# Altium footprint library Connectors.PcbLib: 245 footprints (part 10 of 18) (continued)
## CNSODIMM200-1V8STD [mm] "Tyco 1473006-4" (continued)
Mechanical 13:
  lines w0.127: 1.85,-33.8 32.1,-33.8 32.1,33.8 1.85,33.8 ; 1.85,-32.55 3.7,-32.55 3.7,32.55 ; 16.422,-33.661 16.425,-32.5 16.575,-32.225 18.55,-31.7 21.35,-31.9 21.65,-32.15 21.65,-33.225 21.45,-33.425 ; 16.422,33.661 16.425,32.5 16.575,32.225 18.55,31.7 21.35,31.9 21.65,32.15 21.65,33.225 21.45,33.425 ; 3.7,32.55 1.85,32.55 3.7,32.55 ; -5,-35.55 -5,-32.55 -3.7,-32.55 -3.7,32.55 -5,32.55 -5,35.55 1.85,35.55 1.85,-35.55 -5,-35.55
  lines w0.4: 2,-34.425 7.875,-34.425 9.2,-35.75 16.4,-35.75 ; 2,-34.025 8.675,-34.025 21.45,-33.425 ; 2,34.025 8.675,34.025 21.45,33.425 ; 2,34.425 7.875,34.425 9.2,35.75 16.4,35.75

## CNSODIMM204-1V5STD [mm] "Foxconn"
height 5.2
pads (208):
  rrect50% 2x0.35 smd: 1(-4.1,31.65) 2(4.1,31.35) 3(-4.1,31.05) 4(4.1,30.75) 5(-4.1,30.45) 6(4.1,30.15) 7(-4.1,29.85) 8(4.1,29.55) 9(-4.1,29.25) 10(4.1,28.95) 11(-4.1,28.65) 12(4.1,28.35) 13(-4.1,28.05) 14(4.1,27.75) 15(-4.1,27.45) 16(4.1,27.15) 17(-4.1,26.85) 18(4.1,26.55) 19(-4.1,26.25) 20(4.1,25.95) 21(-4.1,25.65) 22(4.1,25.35) 23(-4.1,25.05) 24(4.1,24.75) 25(-4.1,24.45) 26(4.1,24.15) 27(-4.1,23.85) 28(4.1,23.55) 29(-4.1,23.25) 30(4.1,22.95) 31(-4.1,22.65) 32(4.1,22.35) 33(-4.1,22.05) 34(4.1,21.75) 35(-4.1,21.45) 36(4.1,21.15) 37(-4.1,20.85) 38(4.1,20.55) 39(-4.1,20.25) 40(4.1,19.95) 41(-4.1,19.65) 42(4.1,19.35) 43(-4.1,19.05) 44(4.1,18.75) 45(-4.1,18.45) 46(4.1,18.15) 47(-4.1,17.85) 48(4.1,17.55) 49(-4.1,17.25) 50(4.1,16.95) 51(-4.1,16.65) 52(4.1,16.35) 53(-4.1,16.05) 54(4.1,15.75) 55(-4.1,15.45) 56(4.1,15.15) 57(-4.1,14.85) 58(4.1,14.55) 59(-4.1,14.25) 60(4.1,13.95) 61(-4.1,13.65) 62(4.1,13.35) 63(-4.1,13.05) 64(4.1,12.75) 65(-4.1,12.45) 66(4.1,12.15) 67(-4.1,11.85) 68(4.1,11.55) 69(-4.1,11.25) 70(4.1,10.95) 71(-4.1,10.65) 72(4.1,10.35) 73(-4.1,7.65) 74(4.1,7.35) 75(-4.1,7.05) 76(4.1,6.75) 77(-4.1,6.45) 78(4.1,6.15) 79(-4.1,5.85) 80(4.1,5.55) 81(-4.1,5.25) 82(4.1,4.95) 83(-4.1,4.65) 84(4.1,4.35) 85(-4.1,4.05) 86(4.1,3.75) 87(-4.1,3.45) 88(4.1,3.15) 89(-4.1,2.85) 90(4.1,2.55) 91(-4.1,2.25) 92(4.1,1.95) 93(-4.1,1.65) 94(4.1,1.35) 95(-4.1,1.05) 96(4.1,0.75) 97(-4.1,0.45) 98(4.1,0.15) 99(-4.1,-0.15) 100(4.1,-0.45) 101(-4.1,-0.75) 102(4.1,-1.05) 103(-4.1,-1.35) 104(4.1,-1.65) 105(-4.1,-1.95) 106(4.1,-2.25) 107(-4.1,-2.55) 108(4.1,-2.85) 109(-4.1,-3.15) 110(4.1,-3.45) 111(-4.1,-3.75) 112(4.1,-4.05) 113(-4.1,-4.35) 114(4.1,-4.65) 115(-4.1,-4.95) 116(4.1,-5.25) 117(-4.1,-5.55) 118(4.1,-5.85) 119(-4.1,-6.15) 120(4.1,-6.45) 121(-4.1,-6.75) 122(4.1,-7.05) 123(-4.1,-7.35) 124(4.1,-7.65) 125(-4.1,-7.95) 126(4.1,-8.25) 127(-4.1,-8.55) 128(4.1,-8.85) 129(-4.1,-9.15) 130(4.1,-9.45) 131(-4.1,-9.75) 132(4.1,-10.05) 133(-4.1,-10.35) 134(4.1,-10.65) 135(-4.1,-10.95) 136(4.1,-11.25) 137(-4.1,-11.55) 138(4.1,-11.85) 139(-4.1,-12.15) 140(4.1,-12.45) 141(-4.1,-12.75) 142(4.1,-13.05) 143(-4.1,-13.35) 144(4.1,-13.65) 145(-4.1,-13.95) 146(4.1,-14.25) 147(-4.1,-14.55) 148(4.1,-14.85) 149(-4.1,-15.15) 150(4.1,-15.45) 151(-4.1,-15.75) 152(4.1,-16.05) 153(-4.1,-16.35) 154(4.1,-16.65) 155(-4.1,-16.95) 156(4.1,-17.25) 157(-4.1,-17.55) 158(4.1,-17.85) 159(-4.1,-18.15) 160(4.1,-18.45) 161(-4.1,-18.75) 162(4.1,-19.05) 163(-4.1,-19.35) 164(4.1,-19.65) 165(-4.1,-19.95) 166(4.1,-20.25) 167(-4.1,-20.55) 168(4.1,-20.85) 169(-4.1,-21.15) 170(4.1,-21.45) 171(-4.1,-21.75) 172(4.1,-22.05) 173(-4.1,-22.35) 174(4.1,-22.65) 175(-4.1,-22.95) 176(4.1,-23.25) 177(-4.1,-23.55) 178(4.1,-23.85) 179(-4.1,-24.15) 180(4.1,-24.45) 181(-4.1,-24.75) 182(4.1,-25.05) 183(-4.1,-25.35) 184(4.1,-25.65) 185(-4.1,-25.95) 186(4.1,-26.25) 187(-4.1,-26.55) 188(4.1,-26.85) 189(-4.1,-27.15) 190(4.1,-27.45) 191(-4.1,-27.75) 192(4.1,-28.05) 193(-4.1,-28.35) 194(4.1,-28.65) 195(-4.1,-28.95) 196(4.1,-29.25) 197(-4.1,-29.55) 198(4.1,-29.85) 199(-4.1,-30.15) 200(4.1,-30.45) 201(-4.1,-30.75) 202(4.1,-31.05) 203(-4.1,-31.35) 204(4.1,-31.65)
  round 0 hole 1.6 unplated mask+1: MH1(0,33.4)
  round 0 hole 1.1 unplated mask+1: MH2(0,-33.4)
  rect 4.6x3.5 smd: MP1(12,32.8) MP2(12,-32.8)
Mechanical 10:
  drawing of 168 lines, arcs and shapes, not listed
Mechanical 13:
  lines w0.127: 20.9,-33.8 31.5,-33.8 31.5,33.8 20.9,33.8 ; 20.9,35.05 20.9,32.8 13.5,32.8 13.5,31.65 10.5,31.65 10.5,32.8 3.1,32.8 3.1,-32.8 10.5,-32.8 10.5,-31.65 13.5,-31.65 13.5,-32.8 20.9,-32.8 20.9,-35.1 -1.45,-35.1 ccw(c-2.174,-35.824) -2.174,-34.8 -5,-34.8 -5,-34 -3.1,-34 -3.1,34 -5,34 -5,34.8 -2.174,34.8 ccw(c-2.174,35.824) -1.45,35.1 20.9,35.1
Mechanical 15:
  text "Component height under module max is 1.3mm" at 24.8,31.8 h1.52
3D body: height 5.03, standoff -0.82, extent -5.025,-35.1 20.875,35.1
3D body: height 5.13, standoff 3.78, extent 7.935,-1.3 12.635,2.3
3D body: height 5.13, standoff 3.78, extent 7.935,-27.3 26.535,-18.3
3D body: height 2.68, standoff 1.33, extent 7.935,-27.3 26.535,-18.3
3D body: height 5.13, standoff 3.78, extent 7.935,-16 26.535,-7
3D body: height 2.68, standoff 1.33, extent 7.935,-16 26.535,-7
3D body: height 5.13, standoff 3.78, extent 7.935,7 26.535,16
3D body: height 2.68, standoff 1.33, extent 7.935,7 26.535,16
3D body: height 2.68, standoff 1.33, extent 7.935,18.3 26.535,27.3
3D body: height 5.13, standoff 3.78, extent 7.935,18.3 26.535,27.3
3D body: height 2.68, standoff 2.67, extent -0.415,-31.35 2.135,-31.021
3D body: height 3.79, standoff 3.78, extent -0.415,-31.35 2.135,-31.021
3D body: height 2.68, standoff 2.67, extent -0.415,-30.868 2.135,-30.538
3D body: height 3.79, standoff 3.78, extent -0.415,-30.868 2.135,-30.538
3D body: height 2.68, standoff 2.67, extent -0.415,-30.411 2.135,-30.081
3D body: height 3.79, standoff 3.78, extent -0.415,-30.411 2.135,-30.081
3D body: height 2.68, standoff 2.67, extent -0.415,-29.928 2.135,-29.599
3D body: height 3.79, standoff 3.78, extent -0.415,-29.928 2.135,-29.599
3D body: height 2.68, standoff 2.67, extent -0.415,-29.445 2.135,-29.116
3D body: height 3.79, standoff 3.78, extent -0.415,-29.445 2.135,-29.116
3D body: height 2.68, standoff 2.67, extent -0.415,-28.988 2.135,-28.659
3D body: height 3.79, standoff 3.78, extent -0.415,-28.988 2.135,-28.659
3D body: height 2.68, standoff 2.67, extent -0.415,-28.506 2.135,-28.176
3D body: height 3.79, standoff 3.78, extent -0.415,-28.506 2.135,-28.176
3D body: height 2.68, standoff 2.67, extent -0.415,-27.998 2.135,-27.668
3D body: height 3.79, standoff 3.78, extent -0.415,-27.998 2.135,-27.668
3D body: height 2.68, standoff 2.67, extent -0.415,-27.54 2.135,-27.211
3D body: height 3.79, standoff 3.78, extent -0.415,-27.54 2.135,-27.211
3D body: height 2.68, standoff 2.67, extent -0.415,-27.058 2.135,-26.728
3D body: height 3.79, standoff 3.78, extent -0.415,-27.058 2.135,-26.728
3D body: height 2.68, standoff 2.67, extent -0.415,-26.575 2.135,-26.246
3D body: height 3.79, standoff 3.78, extent -0.415,-26.575 2.135,-26.246
3D body: height 2.68, standoff 2.67, extent -0.415,-26.093 2.135,-25.763
3D body: height 3.79, standoff 3.78, extent -0.415,-26.093 2.135,-25.763
3D body: height 2.68, standoff 2.67, extent -0.415,-25.635 2.135,-25.306
3D body: height 3.79, standoff 3.78, extent -0.415,-25.635 2.135,-25.306
3D body: height 2.68, standoff 2.67, extent -0.415,-25.153 2.135,-24.823
3D body: height 3.79, standoff 3.78, extent -0.415,-25.153 2.135,-24.823
3D body: height 2.68, standoff 2.67, extent -0.415,-24.67 2.135,-24.341
3D body: height 3.79, standoff 3.78, extent -0.415,-24.67 2.135,-24.341
3D body: height 2.68, standoff 2.67, extent -0.415,-24.188 2.135,-23.858
3D body: height 3.79, standoff 3.78, extent -0.415,-24.188 2.135,-23.858
3D body: height 2.68, standoff 2.67, extent -0.415,-23.705 2.135,-23.376
3D body: height 3.79, standoff 3.78, extent -0.415,-23.705 2.135,-23.376
3D body: height 2.68, standoff 2.67, extent -0.415,-23.222 2.135,-22.893
3D body: height 3.79, standoff 3.78, extent -0.415,-23.222 2.135,-22.893
3D body: height 2.68, standoff 2.67, extent -0.415,-22.74 2.135,-22.41
3D body: height 3.79, standoff 3.78, extent -0.415,-22.74 2.135,-22.41
3D body: height 2.68, standoff 2.67, extent -0.415,-22.283 2.135,-21.953
3D body: height 3.79, standoff 3.78, extent -0.415,-22.283 2.135,-21.953
3D body: height 2.68, standoff 2.67, extent -0.415,-21.8 2.135,-21.471
3D body: height 3.79, standoff 3.78, extent -0.415,-21.8 2.135,-21.471
3D body: height 2.68, standoff 2.67, extent -0.415,-21.317 2.135,-20.988
3D body: height 3.79, standoff 3.78, extent -0.415,-21.317 2.135,-20.988
3D body: height 2.68, standoff 2.67, extent -0.415,-20.86 2.135,-20.531
3D body: height 3.79, standoff 3.78, extent -0.415,-20.86 2.135,-20.531
3D body: height 2.68, standoff 2.67, extent -0.415,-20.378 2.135,-20.048
3D body: height 3.79, standoff 3.78, extent -0.415,-20.378 2.135,-20.048
3D body: height 2.68, standoff 2.67, extent -0.415,-19.895 2.135,-19.566
3D body: height 3.79, standoff 3.78, extent -0.415,-19.895 2.135,-19.566
3D body: height 2.68, standoff 2.67, extent -0.415,-19.412 2.135,-19.083
3D body: height 3.79, standoff 3.78, extent -0.415,-19.412 2.135,-19.083
3D body: height 2.68, standoff 2.67, extent -0.415,-18.93 2.135,-18.6
3D body: height 3.79, standoff 3.78, extent -0.415,-18.93 2.135,-18.6
3D body: height 2.68, standoff 2.67, extent -0.415,-18.447 2.135,-18.118
3D body: height 3.79, standoff 3.78, extent -0.415,-18.447 2.135,-18.118
3D body: height 2.68, standoff 2.67, extent -0.415,-17.965 2.135,-17.635
3D body: height 3.79, standoff 3.78, extent -0.415,-17.965 2.135,-17.635
3D body: height 2.68, standoff 2.67, extent -0.415,-17.507 2.135,-17.178
3D body: height 3.79, standoff 3.78, extent -0.415,-17.507 2.135,-17.178
3D body: height 2.68, standoff 2.67, extent -0.415,-17.025 2.135,-16.695
3D body: height 3.79, standoff 3.78, extent -0.415,-17.025 2.135,-16.695
3D body: height 2.68, standoff 2.67, extent -0.415,-16.542 2.135,-16.213
3D body: height 3.79, standoff 3.78, extent -0.415,-16.542 2.135,-16.213
3D body: height 2.68, standoff 2.67, extent -0.415,-16.085 2.135,-15.756
3D body: height 3.79, standoff 3.78, extent -0.415,-16.085 2.135,-15.756
3D body: height 2.68, standoff 2.67, extent -0.415,-15.602 2.135,-15.273
3D body: height 3.79, standoff 3.78, extent -0.415,-15.602 2.135,-15.273
3D body: height 2.68, standoff 2.67, extent -0.415,-15.094 2.135,-14.765
3D body: height 3.79, standoff 3.78, extent -0.415,-15.094 2.135,-14.765
3D body: height 2.68, standoff 2.67, extent -0.415,-14.637 2.135,-14.308
3D body: height 3.79, standoff 3.78, extent -0.415,-14.637 2.135,-14.308
3D body: height 2.68, standoff 2.67, extent -0.415,-14.155 2.135,-13.825
3D body: height 3.79, standoff 3.78, extent -0.415,-14.155 2.135,-13.825
3D body: height 2.68, standoff 2.67, extent -0.415,-13.672 2.135,-13.343
3D body: height 3.79, standoff 3.78, extent -0.415,-13.672 2.135,-13.343
3D body: height 2.68, standoff 2.67, extent -0.415,-13.215 2.135,-12.885
3D body: height 3.79, standoff 3.78, extent -0.415,-13.215 2.135,-12.885
3D body: height 2.68, standoff 2.67, extent -0.415,-12.732 2.135,-12.403
3D body: height 3.79, standoff 3.78, extent -0.415,-12.732 2.135,-12.403
3D body: height 2.68, standoff 2.67, extent -0.415,-12.25 2.135,-11.92
3D body: height 3.79, standoff 3.78, extent -0.415,-12.25 2.135,-11.92
3D body: height 2.68, standoff 2.67, extent -0.415,-11.767 2.135,-11.438
3D body: height 3.79, standoff 3.78, extent -0.415,-11.767 2.135,-11.438
3D body: height 2.68, standoff 2.67, extent -0.415,-11.31 2.135,-10.98
3D body: height 3.79, standoff 3.78, extent -0.415,-11.31 2.135,-10.98
3D body: height 2.68, standoff 2.67, extent -0.415,-10.827 2.135,-10.498
3D body: height 3.79, standoff 3.78, extent -0.415,-10.827 2.135,-10.498
3D body: height 2.68, standoff 2.67, extent -0.415,-10.319 2.135,-9.99
3D body: height 3.79, standoff 3.78, extent -0.415,-10.319 2.135,-9.99
3D body: height 2.68, standoff 2.67, extent -0.415,-9.862 2.135,-9.533
3D body: height 3.79, standoff 3.78, extent -0.415,-9.862 2.135,-9.533
3D body: height 2.68, standoff 2.67, extent -0.415,-9.379 2.135,-9.05
3D body: height 3.79, standoff 3.78, extent -0.415,-9.379 2.135,-9.05
3D body: height 2.68, standoff 2.67, extent -0.415,-8.897 2.135,-8.567
3D body: height 3.79, standoff 3.78, extent -0.415,-8.897 2.135,-8.567
3D body: height 2.68, standoff 2.67, extent -0.415,-8.44 2.135,-8.11
3D body: height 3.79, standoff 3.78, extent -0.415,-8.44 2.135,-8.11
3D body: height 2.68, standoff 2.67, extent -0.415,-7.957 2.135,-7.628
3D body: height 3.79, standoff 3.78, extent -0.415,-7.957 2.135,-7.628
3D body: height 2.68, standoff 2.67, extent -0.415,-7.474 2.135,-7.145
3D body: height 3.79, standoff 3.78, extent -0.415,-7.474 2.135,-7.145
3D body: height 2.68, standoff 2.67, extent -0.415,-6.992 2.135,-6.662
3D body: height 3.79, standoff 3.78, extent -0.415,-6.992 2.135,-6.662
3D body: height 2.68, standoff 2.67, extent -0.415,-6.509 2.135,-6.18
3D body: height 3.79, standoff 3.78, extent -0.415,-6.509 2.135,-6.18
3D body: height 2.68, standoff 2.67, extent -0.415,-6.027 2.135,-5.697
3D body: height 3.79, standoff 3.78, extent -0.415,-6.027 2.135,-5.697
3D body: height 2.68, standoff 2.67, extent -0.415,-5.544 2.135,-5.215
3D body: height 3.79, standoff 3.78, extent -0.415,-5.544 2.135,-5.215
3D body: height 2.68, standoff 2.67, extent -0.415,-5.061 2.135,-4.732
3D body: height 3.79, standoff 3.78, extent -0.415,-5.061 2.135,-4.732
3D body: height 2.68, standoff 2.67, extent -0.415,-4.604 2.135,-4.275
3D body: height 3.79, standoff 3.78, extent -0.415,-4.604 2.135,-4.275
3D body: height 2.68, standoff 2.67, extent -0.415,-4.122 2.135,-3.792
3D body: height 3.79, standoff 3.78, extent -0.415,-4.122 2.135,-3.792
3D body: height 2.68, standoff 2.67, extent -0.415,-3.664 2.135,-3.335
3D body: height 3.79, standoff 3.78, extent -0.415,-3.664 2.135,-3.335
3D body: height 2.68, standoff 2.67, extent -0.415,-3.182 2.135,-2.852
3D body: height 3.79, standoff 3.78, extent -0.415,-3.182 2.135,-2.852
3D body: height 2.68, standoff 2.67, extent -0.415,-2.699 2.135,-2.37
3D body: height 3.79, standoff 3.78, extent -0.415,-2.699 2.135,-2.37
3D body: height 2.68, standoff 2.67, extent -0.415,-2.217 2.135,-1.887
3D body: height 3.79, standoff 3.78, extent -0.415,-2.217 2.135,-1.887
3D body: height 2.68, standoff 2.67, extent -0.415,-1.734 2.135,-1.405
3D body: height 3.79, standoff 3.78, extent -0.415,-1.734 2.135,-1.405
3D body: height 2.68, standoff 2.67, extent -0.415,-1.251 2.135,-0.922
3D body: height 3.79, standoff 3.78, extent -0.415,-1.251 2.135,-0.922
3D body: height 2.68, standoff 2.67, extent -0.415,-0.769 2.135,-0.439
3D body: height 3.79, standoff 3.78, extent -0.415,-0.769 2.135,-0.439
3D body: height 2.68, standoff 2.67, extent -0.415,-0.312 2.135,0.018
3D body: height 3.79, standoff 3.78, extent -0.415,-0.312 2.135,0.018
3D body: height 2.68, standoff 2.67, extent -0.415,0.171 2.135,0.5
3D body: height 3.79, standoff 3.78, extent -0.415,0.171 2.135,0.5
3D body: height 2.68, standoff 2.67, extent -0.415,0.654 2.135,0.983
3D body: height 3.79, standoff 3.78, extent -0.415,0.654 2.135,0.983
3D body: height 2.68, standoff 2.67, extent -0.415,1.111 2.135,1.44
3D body: height 3.79, standoff 3.78, extent -0.415,1.111 2.135,1.44
3D body: height 2.68, standoff 2.67, extent -0.415,1.593 2.135,1.923
3D body: height 3.79, standoff 3.78, extent -0.415,1.593 2.135,1.923
3D body: height 2.68, standoff 2.67, extent -0.415,2.076 2.135,2.405
3D body: height 3.79, standoff 3.78, extent -0.415,2.076 2.135,2.405
3D body: height 2.68, standoff 2.67, extent -0.415,2.584 2.135,2.913
3D body: height 3.79, standoff 3.78, extent -0.415,2.584 2.135,2.913
3D body: height 2.68, standoff 2.67, extent -0.415,3.041 2.135,3.371
3D body: height 3.79, standoff 3.78, extent -0.415,3.041 2.135,3.371
3D body: height 2.68, standoff 2.67, extent -0.415,3.524 2.135,3.853
3D body: height 3.79, standoff 3.78, extent -0.415,3.524 2.135,3.853
3D body: height 2.68, standoff 2.67, extent -0.415,4.006 2.135,4.336
3D body: height 3.79, standoff 3.78, extent -0.415,4.006 2.135,4.336
3D body: height 2.68, standoff 2.67, extent -0.415,4.464 2.135,4.793
3D body: height 3.79, standoff 3.78, extent -0.415,4.464 2.135,4.793
3D body: height 2.68, standoff 2.67, extent -0.415,4.946 2.135,5.276
3D body: height 3.79, standoff 3.78, extent -0.415,4.946 2.135,5.276
3D body: height 2.68, standoff 2.67, extent -0.415,5.429 2.135,5.758
3D body: height 3.79, standoff 3.78, extent -0.415,5.429 2.135,5.758
3D body: height 2.68, standoff 2.67, extent -0.415,5.886 2.135,6.215
3D body: height 3.79, standoff 3.78, extent -0.415,5.886 2.135,6.215
3D body: height 2.68, standoff 2.67, extent -0.415,6.394 2.135,6.723
3D body: height 3.79, standoff 3.78, extent -0.415,6.394 2.135,6.723
3D body: height 2.68, standoff 2.67, extent -0.415,6.877 2.135,7.206
3D body: height 3.79, standoff 3.78, extent -0.415,6.877 2.135,7.206
3D body: height 2.68, standoff 2.67, extent -0.415,10.912 2.135,11.241
3D body: height 3.79, standoff 3.78, extent -0.415,10.912 2.135,11.241
3D body: height 2.68, standoff 2.67, extent -0.415,11.387 2.135,11.716
3D body: height 3.79, standoff 3.78, extent -0.415,11.387 2.135,11.716
3D body: height 2.68, standoff 2.67, extent -0.415,11.869 2.135,12.199
3D body: height 3.79, standoff 3.78, extent -0.415,11.869 2.135,12.199
3D body: height 2.68, standoff 2.67, extent -0.415,12.352 2.135,12.681
3D body: height 3.79, standoff 3.78, extent -0.415,12.352 2.135,12.681
3D body: height 2.68, standoff 2.67, extent -0.415,12.835 2.135,13.164
3D body: height 3.79, standoff 3.78, extent -0.415,12.835 2.135,13.164
3D body: height 2.68, standoff 2.67, extent -0.415,13.317 2.135,13.647
3D body: height 3.79, standoff 3.78, extent -0.415,13.317 2.135,13.647
3D body: height 2.68, standoff 2.67, extent -0.415,13.79 2.135,14.119
3D body: height 3.79, standoff 3.78, extent -0.415,13.79 2.135,14.119
3D body: height 2.68, standoff 2.67, extent -0.415,14.265 2.135,14.594
3D body: height 3.79, standoff 3.78, extent -0.415,14.265 2.135,14.594
3D body: height 2.68, standoff 2.67, extent -0.415,14.74 2.135,15.069
3D body: height 3.79, standoff 3.78, extent -0.415,14.74 2.135,15.069
3D body: height 2.68, standoff 2.67, extent -0.415,15.22 2.135,15.549
3D body: height 3.79, standoff 3.78, extent -0.415,15.22 2.135,15.549
3D body: height 2.68, standoff 2.67, extent -0.415,15.695 2.135,16.024
3D body: height 3.79, standoff 3.78, extent -0.415,15.695 2.135,16.024
3D body: height 2.68, standoff 2.67, extent -0.415,16.17 2.135,16.499
3D body: height 3.79, standoff 3.78, extent -0.415,16.17 2.135,16.499
3D body: height 2.68, standoff 2.67, extent -0.415,16.645 2.135,16.974
3D body: height 3.79, standoff 3.78, extent -0.415,16.645 2.135,16.974
3D body: height 2.68, standoff 2.67, extent -0.415,17.127 2.135,17.457
3D body: height 3.79, standoff 3.78, extent -0.415,17.127 2.135,17.457
3D body: height 2.68, standoff 2.67, extent -0.415,17.61 2.135,17.939
3D body: height 3.79, standoff 3.78, extent -0.415,17.61 2.135,17.939
3D body: height 2.68, standoff 2.67, extent -0.415,18.092 2.135,18.422
3D body: height 3.79, standoff 3.78, extent -0.415,18.092 2.135,18.422
3D body: height 2.68, standoff 2.67, extent -0.415,18.565 2.135,18.894
3D body: height 3.79, standoff 3.78, extent -0.415,18.565 2.135,18.894
3D body: height 2.68, standoff 2.67, extent -0.415,19.04 2.135,19.369
3D body: height 3.79, standoff 3.78, extent -0.415,19.04 2.135,19.369
3D body: height 2.68, standoff 2.67, extent -0.415,19.515 2.135,19.844
3D body: height 3.79, standoff 3.78, extent -0.415,19.515 2.135,19.844
3D body: height 2.68, standoff 2.67, extent -0.415,19.997 2.135,20.327
3D body: height 3.79, standoff 3.78, extent -0.415,19.997 2.135,20.327
3D body: height 2.68, standoff 2.67, extent -0.415,20.462 2.135,20.792
3D body: height 3.79, standoff 3.78, extent -0.415,20.462 2.135,20.792
3D body: height 2.68, standoff 2.67, extent -0.415,20.937 2.135,21.267
3D body: height 3.79, standoff 3.78, extent -0.415,20.937 2.135,21.267
3D body: height 2.68, standoff 2.67, extent -0.415,21.42 2.135,21.749
3D body: height 3.79, standoff 3.78, extent -0.415,21.42 2.135,21.749
3D body: height 2.68, standoff 2.67, extent -0.415,21.902 2.135,22.232
3D body: height 3.79, standoff 3.78, extent -0.415,21.902 2.135,22.232
3D body: height 2.68, standoff 2.67, extent -0.415,22.4 2.135,22.73
3D body: height 3.79, standoff 3.78, extent -0.415,22.4 2.135,22.73
3D body: height 2.68, standoff 2.67, extent -0.415,22.875 2.135,23.205
3D body: height 3.79, standoff 3.78, extent -0.415,22.875 2.135,23.205
3D body: height 2.68, standoff 2.67, extent -0.415,23.35 2.135,23.68
3D body: height 3.79, standoff 3.78, extent -0.415,23.35 2.135,23.68
3D body: height 2.68, standoff 2.67, extent -0.415,23.823 2.135,24.152
3D body: height 3.79, standoff 3.78, extent -0.415,23.823 2.135,24.152
3D body: height 2.68, standoff 2.67, extent -0.415,24.298 2.135,24.627
3D body: height 3.79, standoff 3.78, extent -0.415,24.298 2.135,24.627
3D body: height 2.68, standoff 2.67, extent -0.415,24.773 2.135,25.102
3D body: height 3.79, standoff 3.78, extent -0.415,24.773 2.135,25.102
3D body: height 2.68, standoff 2.67, extent -0.415,25.255 2.135,25.585
3D body: height 3.79, standoff 3.78, extent -0.415,25.255 2.135,25.585
3D body: height 2.68, standoff 2.67, extent -0.415,25.712 2.135,26.042
3D body: height 3.79, standoff 3.78, extent -0.415,25.712 2.135,26.042
3D body: height 2.68, standoff 2.67, extent -0.415,26.225 2.135,26.555
3D body: height 3.79, standoff 3.78, extent -0.415,26.225 2.135,26.555
3D body: height 2.68, standoff 2.67, extent -0.415,26.7 2.135,27.03
3D body: height 3.79, standoff 3.78, extent -0.415,26.7 2.135,27.03
3D body: height 2.68, standoff 2.67, extent -0.415,27.175 2.135,27.505
3D body: height 3.79, standoff 3.78, extent -0.415,27.175 2.135,27.505
3D body: height 2.68, standoff 2.67, extent -0.415,27.65 2.135,27.98
3D body: height 3.79, standoff 3.78, extent -0.415,27.65 2.135,27.98
3D body: height 2.68, standoff 2.67, extent -0.415,28.125 2.135,28.455
3D body: height 3.79, standoff 3.78, extent -0.415,28.125 2.135,28.455
3D body: height 2.68, standoff 2.67, extent -0.415,29.546 2.135,29.875
3D body: height 3.79, standoff 3.78, extent -0.415,29.546 2.135,29.875
3D body: height 3.79, standoff 3.78, extent -0.415,29.071 2.135,29.4
3D body: height 2.68, standoff 2.67, extent -0.415,29.071 2.135,29.4
3D body: height 3.79, standoff 3.78, extent -0.415,28.596 2.135,28.925
3D body: height 2.68, standoff 2.67, extent -0.415,28.596 2.135,28.925
3D body: height 2.68, standoff 2.67, extent -0.415,30.021 2.135,30.35
3D body: height 3.79, standoff 3.78, extent -0.415,30.021 2.135,30.35
3D body: height 2.68, standoff 2.67, extent -0.415,30.521 2.135,30.85
3D body: height 3.79, standoff 3.78, extent -0.415,30.521 2.135,30.85
3D body: height 2.68, standoff 2.67, extent -0.415,30.996 2.135,31.325
3D body: height 3.79, standoff 3.78, extent -0.415,30.996 2.135,31.325
3D body: height 3.79, standoff 3.78, extent -0.415,31.471 2.135,31.8
3D body: height 2.68, standoff 2.67, extent -0.415,31.471 2.135,31.8
3D body: height 3.78, standoff 2.68, extent -0.415,-33.875 29.735,33.875

## CNTMM10501_SMD9 [mm] "Connector TMM Terminal strip, SMD 9pin"
height 6
pads (9):
  rect 0.8x2.7 smd: 1(-4,-2.05) 2(-4,2.05) 3(-2,-2.05) 4(-2,2.05) 5(0,-2.05) 6(0,2.05) 7(2,-2.05) 8(2,2.05) 10(4,2.05)
Mechanical 13:
  lines w0.102: -5,-1.97 5,-1.97 5,1.97 -5,1.97 -5,-1.97
Mechanical 15:
  lines w0.102: -0.5,0 0.5,0 ; 0,-0.5 0,0.5
3D body: height 0.51, standoff 0, extent -4.25,-3.325 -3.75,-0.775
3D body: height 0.51, standoff 0, extent -2.25,-3.325 -1.75,-0.775
3D body: height 0.51, standoff 0, extent -0.25,-3.325 0.25,-0.775
3D body: height 0.51, standoff 0, extent 1.75,-3.325 2.25,-0.775
3D body: height 0.51, standoff 0, extent 3.75,0.775 4.25,3.325
3D body: height 0.51, standoff 0, extent 1.75,0.775 2.25,3.325
3D body: height 0.51, standoff 0, extent -0.25,0.775 0.25,3.325
3D body: height 0.51, standoff 0, extent -2.25,0.775 -1.75,3.325
3D body: height 0.51, standoff 0, extent -4.25,0.775 -3.75,3.325
3D body: height 6, standoff 0, extent -4.25,0.775 -3.75,1.275
3D body: height 6, standoff 0, extent -2.25,0.775 -1.75,1.275
3D body: height 6, standoff 0, extent 1.75,0.775 2.25,1.275
3D body: height 6, standoff 0, extent 3.75,0.775 4.25,1.275
3D body: height 6, standoff 0, extent 1.75,-1.275 2.25,-0.775
3D body: height 6, standoff 0, extent -4.25,-1.275 -3.75,-0.775
3D body: height 6, standoff 0, extent -2.25,-1.275 -1.75,-0.775
3D body: height 6, standoff 0, extent -0.25,-1.275 0.25,-0.775
3D body: height 6, standoff 0, extent -0.25,0.775 0.25,1.275
3D body: height 2.77, standoff 1.27, extent -5.004,-1.981 5.029,1.981